# Altium footprint library custom.PcbLib: 330 footprints (part 5 of 21)
Each footprint in its own frame and in the unit in brackets; x right, y up, seen from the top. Pads: shape width x height; smd on the part's side, far side on the other; paste and mask are expansions set on the pad; w line width, h text height; cw(c..) or ccw(c..) is an arc to the next point about the centre after c.
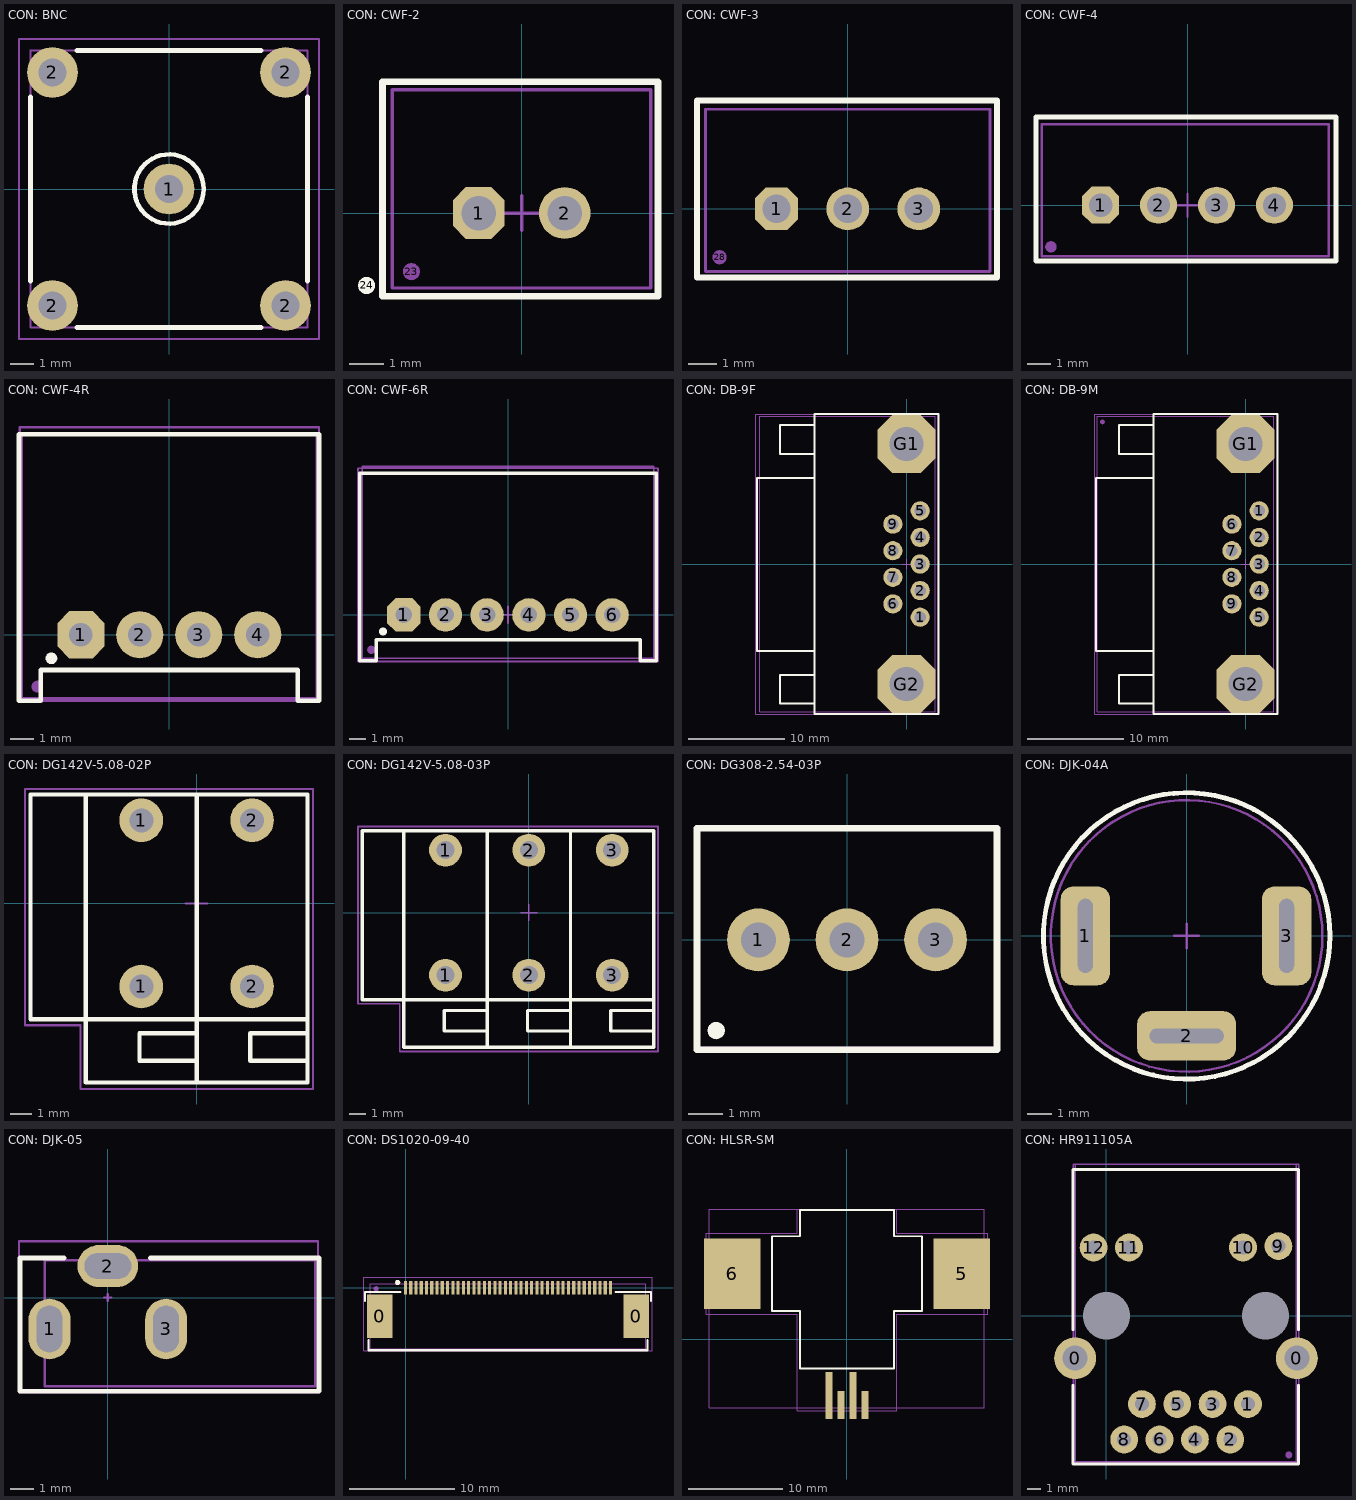
[diagram p4: the footprints below, top view; thin cyan lines are the x and y axes]

## CON: BNC [mm]
pads (5):
  round 2.2 hole 1.2: 1(0,0) 2(-5.05,-5.05) 2(-5.05,5.05) 2(5.05,-5.05) 2(5.05,5.05)
Top Overlay:
  circle w0.2: c0,0 r1.5
  lines w0.2: -6,-4 -6,4 ; -4,-6 4,-6 ; -4,6 4,6 ; 6,-4 6,4
Top Assy:
  circle w0.1: c0,0 r1.5
  lines w0.1: -6,6 -6,-6 6,-6 6,6 6,6 -6,6 ; -6,6 -6,6
Size Area:
  lines w0.1: -1,0 1,0 ; 0,-1 0,1 ; -6.5,-6.5 6.5,-6.5 6.5,6.5 -6.5,6.5 -6.5,-6.5
3D body "9962.stp": height 13, standoff -4.5, extent -6,-6 6,6

## CON: CWF-2 [mm]
height 7.7
pads (4):
  oct 1.5x1.5 hole 1: 1(-1.25,0)
  round 1.5 hole 1: 2(1.25,0)
  round 0.5 on Mech1: 23(-3.2,-1.7)
  round 0.5 on Top Overlay: 24(-4.5,-2.1)
Top Overlay:
  lines w0.2: -4.044,-2.413 3.957,-2.413 3.957,3.81 -4.044,3.81 -4.044,-2.413
Top Assy:
  lines w0.1: -3.75,-2.175 -3.75,3.575 3.75,3.575 3.75,-2.175 -3.75,-2.175
Size Area:
  lines w0.1: -0.5,0 0.5,0 ; 0,-0.5 0,0.5 ; -4.044,-2.413 3.957,-2.413 3.957,3.81 -4.044,3.81 -4.044,-2.413
3D body "CWF-2.step": height 7, standoff -3.5, extent -3.75,-2.175 3.75,3.575

## CON: CWF-3 [mm]
height 7.7
pads (4):
  oct 1.5x1.5 hole 1: 1(-2.5,0)
  round 1.5 hole 1: 2(0,0) 3(2.5,0)
  round 0.5 on Mech1: 28(-4.5,-1.7)
Top Overlay:
  lines w0.2: -5.294,-2.413 5.247,-2.413 5.247,3.81 -5.294,3.81 -5.294,-2.413
Top Assy:
  lines w0.1: -5,-2.2 -5,3.5 5,3.5 5,-2.2 -5,-2.2
Size Area:
  lines w0.1: -0.5,0 0.5,0 ; 0,-0.5 0,0.5 ; -5.294,-2.413 5.247,-2.413 5.247,3.81 -5.294,3.81 -5.294,-2.413
3D body "CWF-3.step": height 7, standoff -3.5, extent -5,-2.2 5,3.55

## CON: CWF-4 [mm]
height 7.7
pads (5):
  oct 1.6x1.6 hole 1: 1(-3.75,0)
  round 1.6 hole 1: 2(-1.25,0) 3(1.25,0) 4(3.75,0)
  round 0.5 on Mech1: ""(-5.9,-1.8)
Top Overlay:
  lines w0.2: -6.544,-2.413 6.41,-2.413 6.41,3.81 -6.544,3.81 -6.544,-2.413
Top Assy:
  lines w0.1: -6.3,-2.2 -6.3,3.5 6.1,3.5 6.1,-2.2 -6.3,-2.2
Size Area:
  lines w0.1: -0.5,0 0.5,0 ; 0,-0.5 0,0.5 ; -6.544,-2.413 6.41,-2.413 6.41,3.81 -6.544,3.81 -6.544,-2.413
3D body "CWF-4.step": height 7, standoff -3.5, extent -6.267,-2.194 6.133,3.556

## CON: CWF-4R [mm]
pads (6):
  oct 2x2 hole 1: 1(-3.75,0)
  round 2 hole 1: 2(-1.25,0) 3(1.25,0) 4(3.75,0)
  round 0.5 on Mech1: ""(-5.6,-2.2)
  round 0.5 on Top Overlay: ""(-5,-1)
Top Overlay:
  lines w0.2: -6.375,-2.8 -5.45,-2.8 -5.45,-1.5 5.45,-1.5 5.45,-2.8 6.35,-2.8 6.35,8.5 -6.375,8.5 -6.375,-2.8
Top Assy:
  lines w0.1: -6.25,-2.7 6.25,-2.7 6.25,8.5 -6.25,8.5 -6.25,-2.7
Size Area:
  lines w0.1: -6.35,-2.8 6.35,-2.8 6.35,8.8 -6.35,8.8 -6.35,-2.8
3D body "12.STEP": height 5.75, standoff -3.5, extent -6.25,-2.7 6.25,8.8

## CON: CWF-6R [mm]
pads (8):
  oct 2x2 hole 1: 1(-6.25,0)
  round 2 hole 1: 2(-3.75,0) 3(-1.25,0) 4(1.25,0) 5(3.75,0) 6(6.25,0)
  round 0.5 on Mech1: ""(-8.2,-2.1)
  round 0.5 on Top Overlay: ""(-7.5,-1)
Top Overlay:
  lines w0.2: -8.9,-2.75 -8.9,8.5 8.9,8.5 8.9,-2.75 7.925,-2.75 7.925,-1.5 -7.9,-1.5 -7.9,-2.75 -8.9,-2.75
Top Assy:
  lines w0.1: -8.75,-2.6 8.75,-2.6 8.75,8.9 -8.75,8.9 -8.75,-2.6
Size Area:
  lines w0.1: -0.5,0 0.5,0 ; 0,-0.5 0,0.5 ; -9,-2.8 -9,8.8 9,8.8 9,-2.8 -9,-2.8
3D body "User Library-DS1069-6 CWF-6R.STEP": height 5.75, standoff -3.5, extent -8.75,-2.6 8.75,8.9

## CON: DB-9F [mm]
height 12
pads (11):
  round 2 hole 1.2: 1(1.42,-5.54) 2(1.42,-2.77) 3(1.42,0) 4(1.42,2.77) 5(1.42,5.54) 6(-1.42,-4.155) 7(-1.42,-1.385) 8(-1.42,1.385) 9(-1.42,4.155)
  oct 6x6 hole 3.5: G1(0,12.5) G2(0,-12.5)
Top Overlay:
  lines w0.2: -9.58,-14.54 -13.185,-14.54 -13.185,-11.54 -9.58,-11.54 ; -9.58,-9.04 -15.58,-9.04 -15.58,8.96 -9.58,8.96 ; -9.58,11.46 -13.185,11.46 -13.185,14.46 -9.58,14.46 ; -9.58,-15.621 3.325,-15.621 3.325,15.621 -9.58,15.621 -9.58,-15.621
Top Assy:
  lines w0.1: -15.302,-15.405 2.998,-15.405 2.998,15.405 -15.302,15.405 -15.302,-15.405
Size Area:
  lines w0.1: -0.5,0 0.5,0 ; 0,-0.5 0,0.5 ; -15.725,-15.621 -15.725,15.621 3.325,15.621 3.325,-15.621 -15.725,-15.621
3D body "DB-9F.step": height 12.52, standoff -4.35, extent -15.302,-15.405 2.998,15.405

## CON: DB-9M [mm]
height 12
pads (12):
  round 2 hole 1.2: 1(1.42,5.54) 2(1.42,2.77) 3(1.42,0) 4(1.42,-2.77) 5(1.42,-5.54) 6(-1.42,4.155) 7(-1.42,1.385) 8(-1.42,-1.385) 9(-1.42,-4.155)
  round 0.5 on Mech1: 31(-14.9,14.8)
  oct 6x6 hole 3.5: G1(0,12.5) G2(0,-12.5)
Top Overlay:
  lines w0.2: -9.58,-14.54 -13.185,-14.54 -13.185,-11.54 -9.58,-11.54 ; -9.58,-9.04 -15.58,-9.04 -15.58,8.96 -9.58,8.96 ; -9.58,11.46 -13.185,11.46 -13.185,14.46 -9.58,14.46 ; -9.58,-15.621 -9.58,15.621 3.325,15.621 3.325,-15.621 -9.58,-15.621
Top Assy:
  lines w0.1: -15.454,-15.4 2.946,-15.4 2.946,15.4 -15.454,15.4 -15.454,-15.4
Size Area:
  lines w0.1: -0.5,0 0.5,0 ; 0,-0.5 0,0.5 ; -15.725,-15.621 3.325,-15.621 3.325,15.621 -15.725,15.621 -15.725,-15.621
3D body "DB-9M.step": height 12.52, standoff -3.9, extent -15.454,-15.4 2.946,15.4

## CON: DG142V-5.08-02P [mm]
height 14.1
pads (4):
  round 2 hole 1.1: 1(-2.54,-3.81) 1(-2.54,3.81) 2(2.54,-3.81) 2(2.54,3.81)
Top Overlay:
  lines w0.2: -5.08,4.99 -5.08,-8.21 5.08,-8.21 5.08,4.99 -7.62,4.99 -7.62,-5.31 5.08,-5.31 ; 0,-8.21 0,4.99 ; 0,-7.21 -2.62,-7.21 -2.62,-5.96 0,-5.96 ; 5.08,-7.21 2.46,-7.21 2.46,-5.96 5.08,-5.96
Top Assy:
  lines w0.1: -5.08,4.99 -5.08,-8.21 5.08,-8.21 5.08,4.99 -7.62,4.99 -7.62,-5.31 5.08,-5.31 ; 0,-8.21 0,4.99 ; 0,-7.21 -2.62,-7.21 -2.62,-5.96 0,-5.96 ; 5.08,-7.21 2.46,-7.21 2.46,-5.96 5.08,-5.96
Size Area:
  lines w0.1: -0.5,0 0.5,0 ; 0,-0.5 0,0.5 ; -7.874,-5.588 -7.874,5.244 5.334,5.244 5.334,-8.509 -2.413,-8.509 -5.334,-8.509 -5.334,-5.588 -7.874,-5.588
3D body "DG142V-5.08-02P.STEP": height 14.2, standoff 0, extent -7.62,-8.209 5.14,4.99

## CON: DG142V-5.08-03P [mm]
height 14.1
pads (6):
  round 2 hole 1.1: 1(-5.08,-3.81) 1(-5.08,3.81) 2(0,-3.81) 2(0,3.81) 3(5.08,-3.81) 3(5.08,3.81)
Top Overlay:
  lines w0.2: -7.62,4.99 -7.62,-8.21 7.62,-8.21 7.62,4.99 -10.16,4.99 -10.16,-5.31 7.62,-5.31 ; -2.54,-8.21 -2.54,4.99 ; -2.54,-7.21 -5.16,-7.21 -5.16,-5.96 -2.54,-5.96 ; 2.54,-8.21 2.54,4.99 ; 2.54,-7.21 -0.08,-7.21 -0.08,-5.96 2.54,-5.96 ; 7.62,-7.21 5,-7.21 5,-5.96 7.62,-5.96
Top Assy:
  lines w0.1: -7.62,4.99 -7.62,-8.21 7.62,-8.21 7.62,4.99 -10.16,4.99 -10.16,-5.31 7.62,-5.31 ; -2.54,-8.21 -2.54,4.99 ; -2.54,-7.21 -5.16,-7.21 -5.16,-5.96 -2.54,-5.96 ; 2.54,-8.21 2.54,4.99 ; 2.54,-7.21 -0.08,-7.21 -0.08,-5.96 2.54,-5.96 ; 7.62,-7.21 5,-7.21 5,-5.96 7.62,-5.96
Size Area:
  lines w0.1: -0.5,0 0.5,0 ; 0,-0.5 0,0.5 ; -10.414,-5.543 -7.874,-5.543 -7.874,-8.464 7.874,-8.464 7.874,5.252 -10.414,5.252 -10.414,-5.543
3D body "DG142V-5.08-03P.STEP": height 14.2, standoff 0, extent -10.16,-8.209 7.68,4.99

## CON: DG308-2.54-03P [mm]
pads (4):
  round 1.8 hole 1: 1(-2.54,0) 2(0,0) 3(2.54,0)
  round 0.5 on Top Overlay: ""(-3.75,-2.6)
Top Overlay:
  lines w0.2: -4.3,-3.15 4.3,-3.15 4.3,3.2 -4.3,3.2 -4.3,-3.15
Top Assy:
  lines w0.1: -4.26,-3.1 4.26,-3.1 4.26,3.17 -4.26,3.17 -4.26,-3.1
Size Area:
  lines w0.1: -0.5,0 0.5,0 ; 0,-0.5 0,0.5 ; -4.3,-3.15 -4.3,3.2 4.3,3.2 4.3,-3.15 -4.3,-3.15
3D body "DG308-2.54-02P.STEP": height 8.5, standoff -2, extent -4.26,-3.1 4.26,3.17

## CON: DJK-04A [mm]
height 15
pads (3):
  rrect50% 2x4 hole 0.6 slot 3 at 90 deg: 1(-4.1,0) 3(4.05,0)
  rrect50% 4x2 hole 0.6 slot 3 at 0 deg: 2(0,-4.05)
Top Overlay:
  circle w0.2: c0,0 r5.8
Top Assy:
  circle w0.1: c0,0 r5.5
Size Area:
  circle w0.1: c0,0 r5.8
  lines w0.1: -0.5,0 0.5,0 ; 0,-0.5 0,0.5
3D body "DJK-04.STEP": height 15, standoff -6, extent -5.5,-5.5 5.5,5.5

## CON: DJK-05 [mm]
height 8
pads (3):
  oval 1.8x2.6 hole 1.1 slot 2 at 90 deg: 1(-2.5,-1.35) 3(2.5,-1.35)
  oval 2.6x1.8 hole 1.1 slot 2 at 0 deg: 2(0,1.35)
Top Overlay:
  lines w0.2: -1.865,1.698 -3.77,1.698 -3.77,-4.017 9.057,-4.017 9.057,1.698 1.818,1.698
Top Assy:
  lines w0.1: -2.7,-3.8 -2.7,1.6 8.9,1.6 8.9,-3.8 -2.7,-3.8
Size Area:
  lines w0.1: -0.15,0 0.15,0 ; 0,-0.15 0,0.15 ; -3.81,-4.064 9.017,-4.064 9.017,2.413 -3.81,2.413 -3.81,-4.064
3D body "DJK-05.STEP": height 7.3, standoff -3.2, extent -2.71,-3.85 8.89,1.55

## CON: DS1020-09-40 [mm]
pads (44):
  rect 2.4x4.15 smd: 0(-2.45,-2.7) 0(21.95,-2.7)
  rect 0.3x1.25 smd: 1(0,0) 2(0.5,0) 3(1,0) 4(1.5,0) 5(2,0) 6(2.5,0) 7(3,0) 8(3.5,0) 9(4,0) 10(4.5,0) 11(5,0) 12(5.5,0) 13(6,0) 14(6.5,0) 15(7,0) 16(7.5,0) 17(8,0) 18(8.5,0) 19(9,0) 20(9.5,0) 21(10,0) 22(10.5,0) 23(11,0) 24(11.5,0) 25(12,0) 26(12.5,0) 27(13,0) 28(13.5,0) 29(14,0) 30(14.5,0) 31(15,0) 32(15.5,0) 33(16,0) 34(16.5,0) 35(17,0) 36(17.5,0) 37(18,0) 38(18.5,0) 39(19,0) 40(19.5,0)
  round 0.5 on Mech1: ""(-2.8,-0.1)
  round 0.5 on Top Overlay: ""(-0.75,0.5)
Top Overlay:
  lines w0.2: -3.875,-1.25 -3.875,-0.4 -3.85,-0.4 -3.8,-0.4 -0.5,-0.4 ; -3.525,-5 -3.525,-5.95 23,-5.95 23.025,-5.95 23.025,-5 ; 20,-0.4 23.3,-0.4 23.35,-0.4 23.375,-0.4 23.375,-1.25
Top Assy:
  lines w0.1: -3.375,-5.8 22.875,-5.8 22.875,0.4 -3.375,0.4 -3.375,-5.8
Size Area:
  lines w0.1: -4,-6 23.5,-6 23.5,1 -4,1 -4,-6
3D body "4-1734844-0.stp": height 1.88, standoff -0.02, extent -3.375,-5.8 22.875,0.4

## CON: HLSR-SM [mm] "Current transducer"
height 12.5
pads (6):
  rect 0.75x5 smd: 1(-1.905,-6) 3(0.635,-6)
  rect 0.75x3 smd: 2(-0.635,-7) 4(1.905,-7)
  rect 6x7.5 smd: 5(12.25,7) 6(-12.25,7)
Top Overlay:
  lines w0.2: -8,3 -5,3 -5,-3.1 5,-3.1 5,3 8,3 8,11 5,11 5,13.8 -5,13.8 -5,11 -8,11 -8,3
Top Assy:
  lines w0.1: -14.677,-7.325 -14.677,13.875 14.625,13.875 14.625,-7.325 -14.677,-7.325
Size Area:
  lines w0.1: -15,2.7 -15,11.3 -5.3,11.3 -5.3,13.9 5.3,13.9 5.3,11.3 15,11.3 15,2.7 5.3,2.7 5.3,-7.6 -5.3,-7.6 -5.3,2.7 -15,2.7
3D body "Датчик тока HLSR 32-SM.STEP": height 12, standoff 0, extent -14.677,-7.325 14.618,13.875

## CON: HR911105A [mm]
height 14
pads (17):
  round 3 hole 1.8: 0(-2.25,-3.05) 0(13.68,-3.05)
  oval 0.7x0 hole 3.4: 0(0,0) 0(11.43,0)
  round 2 hole 1: 1(10.165,-6.35) 2(8.895,-8.89) 3(7.625,-6.35) 4(6.355,-8.89) 5(5.085,-6.35) 6(3.815,-8.89) 7(2.545,-6.35) 8(1.275,-8.89) 9(12.35,5) 10(9.81,4.9) 11(1.62,4.9) 12(-0.92,4.9)
  round 0.5 on Mech1: ""(13.1,-10)
Top Overlay:
  lines w0.2: -2.4,-5 -2.4,-10.65 13.8,-10.65 13.8,-5 ; -2.4,-1 -2.4,10.5 13.8,10.5 13.8,-1
Top Assy:
  lines w0.1: -2.24,-10.5 13.64,-10.5 13.64,10.9 -2.24,10.9 -2.24,-10.5
Size Area:
  lines w0.1: -2.4,-10.6 13.8,-10.6 13.8,10.9 -2.4,10.9 -2.4,-1 -2.4,-10.6
3D body "User Library-HR911105A.STEP": height 13.6, standoff -2.9, extent -2.24,-10.5 13.64,10.9